# Altium footprint library hphonglib.PcbLib: 703 footprints (part 4 of 44)
Each footprint in its own frame and in the unit in brackets; x right, y up, seen from the top. Pads: shape width x height; smd on the part's side, far side on the other; paste and mask are expansions set on the pad; w line width, h text height; cw(c..) or ccw(c..) is an arc to the next point about the centre after c.
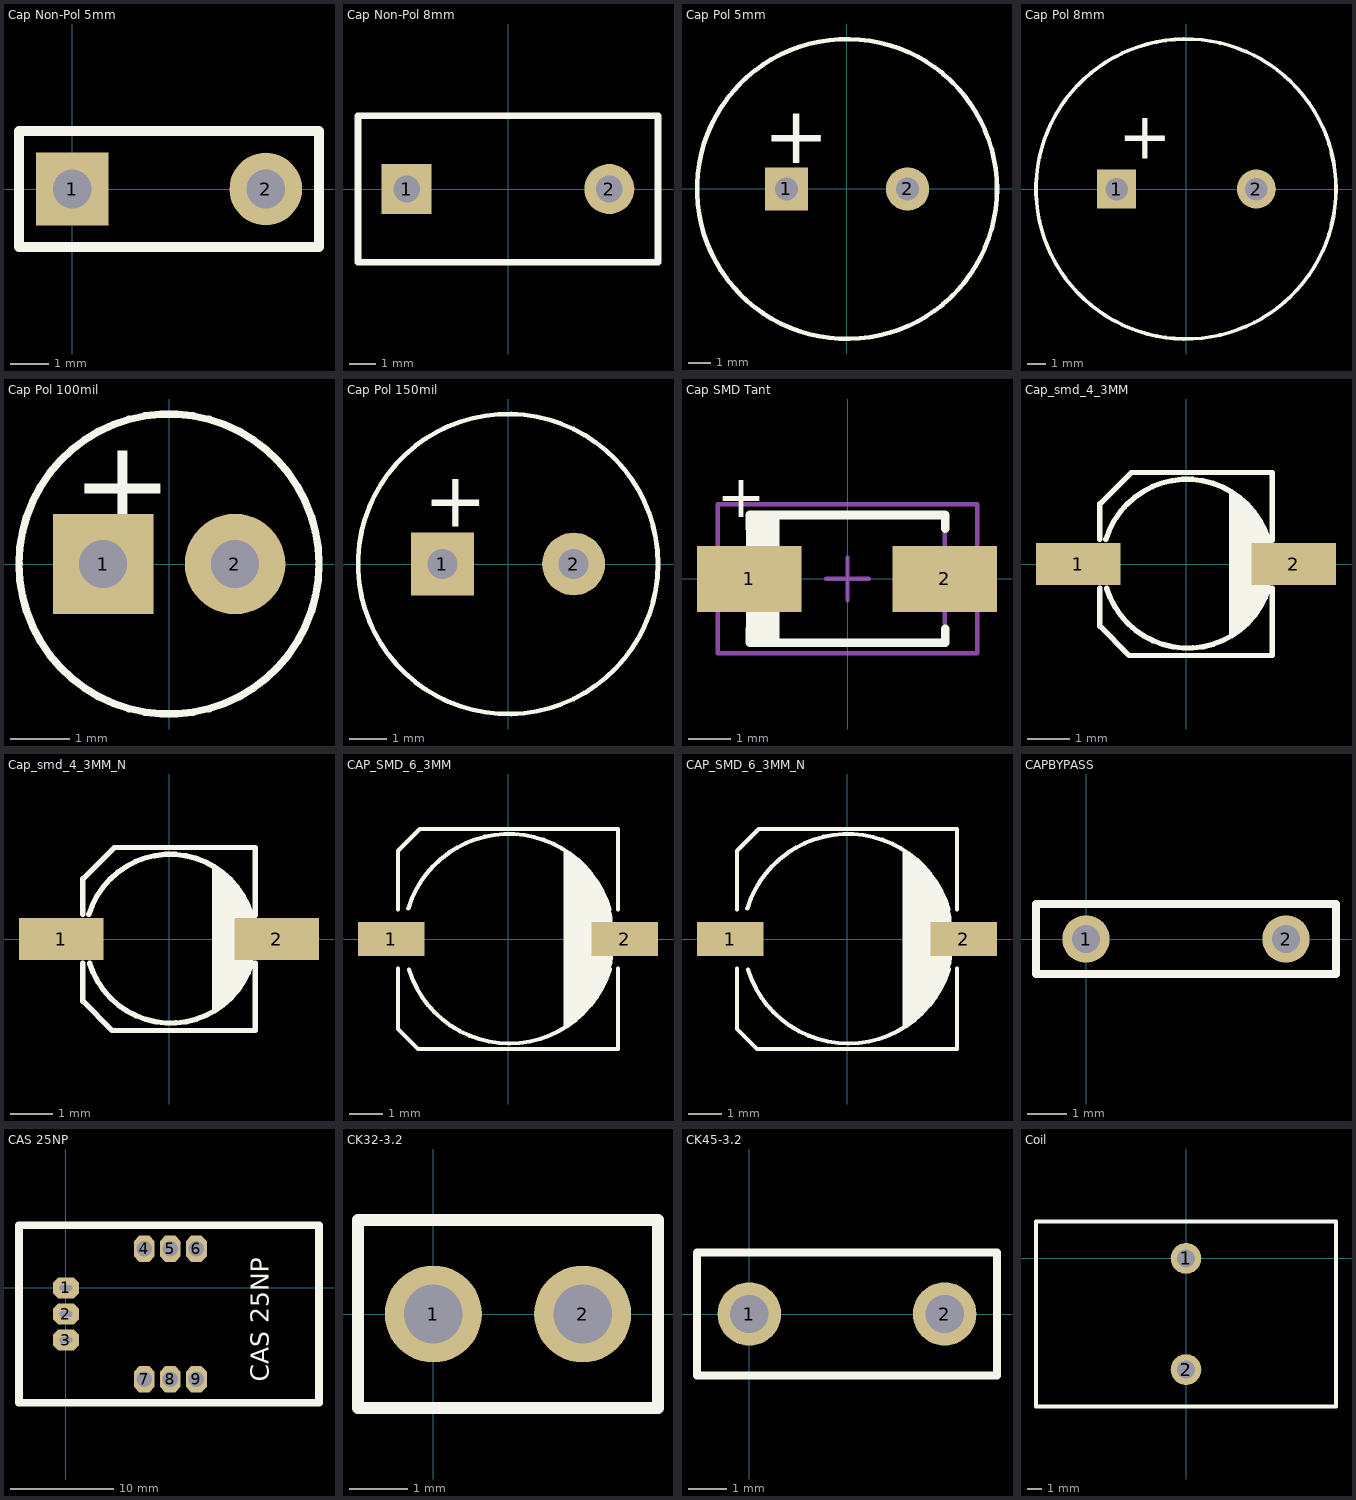
[diagram p3: the footprints below, top view; thin cyan lines are the x and y axes]

## Cap Non-Pol 5mm [mil] "Capacitor, Radial; Body 8 x 3 mm (L x W typ); Pin Spacing 5 mm (typ); Solder Pad 35mil"
pads (2):
  rect 75x75 hole 40: 1(0,0)
  round 75 hole 40: 2(200,0)
Top Overlay:
  lines w10: -55,-60 255,-60 255,60 -55,60 -55,-60
3D body: height 296.28, standoff -97.43, extent -41.73,-59 241.73,59.11

## Cap Non-Pol 8mm [mil] "Capacitor, Radial; Body 11.4 x 5.6 mm (L x W typ); Pin Spacing 8 mm (typ); Solder Pad 35mil"
pads (2):
  rect 75x75 hole 40: 1(-152,0)
  round 75 hole 40: 2(152,0)
Top Overlay:
  lines w10: -225,-110 225,-110 225,110 -225,110 -225,-110
3D body: height 492.13, standoff -98.43, extent -202.76,-98.5 202.76,98.35

## Cap Pol 5mm [mil] "Capacitor, Electrolytic, Radial; Body 5 x 6.8 mm (Dia.xH typ); Pin Spacing 2 mm (typ); Solder Pad 35mil"
pads (2):
  rect 75x75 hole 40: 1(-105,0)
  round 75 hole 40: 2(105,0)
Top Overlay:
  circle w7.87: c0,0 r260
  text "+" at -145,45 h100
3D body: height 787.8, standoff -106.3, extent -245.06,-246.06 245.35,246.07

## Cap Pol 8mm [mil] "Capacitor, Electrolytic, Radial; Body 5 x 6.8 mm (Dia.xH typ); Pin Spacing 2 mm (typ); Solder Pad 35mil"
pads (2):
  rect 83x83 hole 48: 1(-148,0)
  round 83 hole 48: 2(150,0)
Top Overlay:
  circle w7.87: c0,0 r320
  text "+" at -145,65 h100
3D body: height 984.65, standoff -106.3, extent -313.95,-314.96 313.66,314.96

## Cap Pol 100mil [mil] "Capacitor, Electrolytic, Radial; Body 5 x 6.8 mm (Dia.xH typ); Pin Spacing 2 mm (typ); Solder Pad 35mil"
pads (2):
  rect 67x67 hole 32: 1(-44,0)
  round 67 hole 32: 2(44,0)
Top Overlay:
  circle w5: c0,0 r100
  text "+" at -65,25 h59.06
3D body: height 89.3, standoff -470.15, extent -98.42,-98.42 97.98,98.44

## Cap Pol 150mil [mil] "Capacitor, Electrolytic, Radial; Body 5 x 5 mm (Dia.xH typ); Pin Spacing 5 mm (typ); Solder Pad 35mil"
pads (2):
  rect 67x67 hole 32: 1(-70,0)
  round 67 hole 32: 2(70,0)
Top Overlay:
  circle w5: c0,0 r160
  text "+" at -90,40 h59.06
3D body: height 453.15, standoff -106.3, extent -156.98,-157.48 157.02,157.49

## Cap SMD Tant [mm]
height 2.4
pads (2):
  rect 2.45x1.55 smd: 1(-2.311,0) 2(2.286,0)
Top Overlay:
  rectangle: -2.388,-1.499 -1.6,1.5
  lines w0.2: -2.3,-1.175 -2.3,-1.5 2.3,-1.5 2.3,-1.175 ; -2.3,1.175 -2.3,1.5 2.3,1.5 2.3,1.175
  text "+" at -3.073,1.448 h1
Mechanical 13:
  rectangle: -2.285,-1.46 -1.67,1.46
  lines w0.1: -2.285,-1.46 2.285,-1.46 2.285,1.46 -2.285,1.46 -2.285,-1.46
Mechanical 15:
  lines w0.1: -0.5,0 0.5,0 ; 0,-0.5 0,0.5 ; -3.05,-1.75 3.05,-1.75 3.05,1.75 -3.05,1.75 -3.05,-1.75
3D body: height 2.4, standoff 0, extent -2.285,-1.46 2.285,1.46

## Cap_smd_4_3MM [mm] "10uF SMD"
pads (2):
  rect 2x1 smd: 1(-2.54,0) 2(2.54,0)
Top Overlay:
  region: 1.025,1.778 1.279,1.524 1.533,1.397 1.787,0.889 2.041,0.508 2.041,-0.381 1.787,-1.016 1.025,-1.778
  lines w0.127: -2.032,-0.575 -2.032,-1.468 -1.341,-2.159 2.032,-2.159 2.032,-0.565 ; -2.032,0.581 -2.032,1.418 -1.291,2.159 2.032,2.159 2.032,0.564 ; -1.889,0.581 cw(c0.024,0) 1.943,0.564 ; -1.872,-0.575 ccw(c0.039,0.015) 1.952,-0.565
3D body: height 1, standoff 0.1, extent -2.032,-2.159 2.041,2.088
3D body: height 4.51, standoff 4.5, extent 1.025,-1.704 1.937,1.725
3D body: height 4.5, standoff 1, extent -1.909,-2.009 1.884,1.984
3D body: height 1, standoff 0.1, extent -2.71,-0.45 -1.598,0.46
3D body: height 1, standoff 0.1, extent 1.623,-0.435 2.735,0.475

## Cap_smd_4_3MM_N [mm] "10uF SMD"
pads (2):
  rect 2x1 smd: 1(-2.54,0) 2(2.54,0)
Top Overlay:
  region: 1.025,1.778 1.279,1.524 1.533,1.397 1.787,0.889 2.041,0.508 2.041,-0.381 1.787,-1.016 1.025,-1.778
  lines w0.127: -2.032,-0.575 -2.032,-1.468 -1.341,-2.159 2.032,-2.159 2.032,-0.565 ; -2.032,0.581 -2.032,1.418 -1.291,2.159 2.032,2.159 2.032,0.564 ; -1.889,0.581 cw(c0.024,0) 1.943,0.564 ; -1.872,-0.575 ccw(c0.039,0.015) 1.952,-0.565
3D body: height 5.41, standoff -0.01, extent -2.249,-2.166 2.351,2.134

## CAP_SMD_6_3MM [mm] "47uF 25V"
pads (2):
  rect 2x1.016 smd: 1(-3.5,0) 2(3.5,0)
Top Overlay:
  region: 3.15,-0.55 3.125,-0.725 3.05,-0.925 2.9,-1.325 2.725,-1.675 2.525,-1.95 1.9,-2.55 1.675,-2.675 1.675,2.675 2.15,2.35 2.475,1.975 2.775,1.525 3.05,0.975 3.125,0.65 3.15,0.375
  lines w0.127: -3.302,-0.889 -3.302,-2.698 -2.698,-3.302 3.302,-3.302 3.302,-0.889 ; -3.302,0.889 -3.302,2.648 -2.648,3.302 3.302,3.302 3.302,0.889 ; -2.991,0.915 cw(c0.024,0) 3.047,0.889 ; -2.972,-0.914 ccw(c0.039,0.015) 3.053,-0.899
3D body: height 5.52, standoff 5.5, extent 1.7,-2.65 3.15,2.65
3D body: height 5.5, standoff 1, extent -2.987,-3.112 2.989,2.876
3D body: height 1, standoff 0.1, extent -3.25,-3.25 3.225,3.25
3D body: height 1, standoff 0.1, extent -3.798,-0.451 -2.685,0.459
3D body: height 1, standoff 0.1, extent 2.644,-0.46 3.756,0.45

## CAP_SMD_6_3MM_N [mm] "47uF 25V"
pads (2):
  rect 2x1.016 smd: 1(-3.5,0) 2(3.5,0)
Top Overlay:
  region: 3.15,-0.55 3.125,-0.725 3.05,-0.925 2.9,-1.325 2.725,-1.675 2.525,-1.95 1.9,-2.55 1.675,-2.675 1.675,2.675 2.15,2.35 2.475,1.975 2.775,1.525 3.05,0.975 3.125,0.65 3.15,0.375
  lines w0.127: -3.302,-0.889 -3.302,-2.698 -2.698,-3.302 3.302,-3.302 3.302,-0.889 ; -3.302,0.889 -3.302,2.648 -2.648,3.302 3.302,3.302 3.302,0.889 ; -2.991,0.915 cw(c0.024,0) 3.047,0.889 ; -2.972,-0.914 ccw(c0.039,0.015) 3.053,-0.899
3D body: height 5.41, standoff -0.01, extent -3.551,-3.302 3.449,3.298

## CAPBYPASS [mm] "Cap 300x50 - 200"
pads (2):
  round 1.2 hole 0.7: 1(0,0) 2(5.08,0)
Top Overlay:
  lines w0.2: -1.27,-0.889 6.35,-0.889 6.35,0.889 -1.27,0.889 -1.27,-0.889

## CAS 25NP [mil] "Current Sensor LEM"
pads (9):
  oct 100x80 hole 20 slot 50 at 0 deg: 1(0,0) 2(0,-100) 3(0,-200)
  oct 80x100 hole 60: 4(300,150) 5(400,150) 6(500,150) 7(300,-350) 8(400,-350) 9(500,-350)
Top Overlay:
  lines w30: -180,-440 -180,240 -130,240 970,240 970,-440 -180,-440
  text "CAS 25NP" at 800,-360 h120

## CK32-3.2 [mm] "Capacitor, Ceramic, Thru-Hole, Dipped Radial; Body 5.1 x 3.2 mm (WxT) Pin Spacing 2.54 mm (typ)"
height 6
pads (2):
  round 1.65 hole 1: 1(0,0) 2(2.54,0)
Top Overlay:
  lines w0.2: -1.28,-1.6 -1.28,1.6 3.82,1.6 3.82,-1.6 -1.28,-1.6

## CK45-3.2 [mm] "Capacitor, Ceramic, Thru-Hole, Dipped Radial; Body 7.8 x 3.2 mm (WxT) Pin Spacing 5.08 mm (typ)"
height 6
pads (2):
  round 1.65 hole 1: 1(0,0) 2(5.08,0)
Top Overlay:
  lines w0.2: -1.36,-1.6 -1.36,1.6 6.44,1.6 6.44,-1.6 -1.36,-1.6

## Coil [mil] "Ferrite Coil; Filter; Solder Pad 35mil"
pads (2):
  round 83 hole 48: 1(0,0) 2(0,-300)
Top Overlay:
  lines w10: -405,-400 -405,100 405,100 405,-400 -405,-400